# Altium footprint library 430 integreted.PcbLib: 281 footprints (part 14 of 18)
Each footprint in its own frame and in the unit in brackets; x right, y up, seen from the top. Pads: shape width x height; smd on the part's side, far side on the other; paste and mask are expansions set on the pad; w line width, h text height; cw(c..) or ccw(c..) is an arc to the next point about the centre after c.
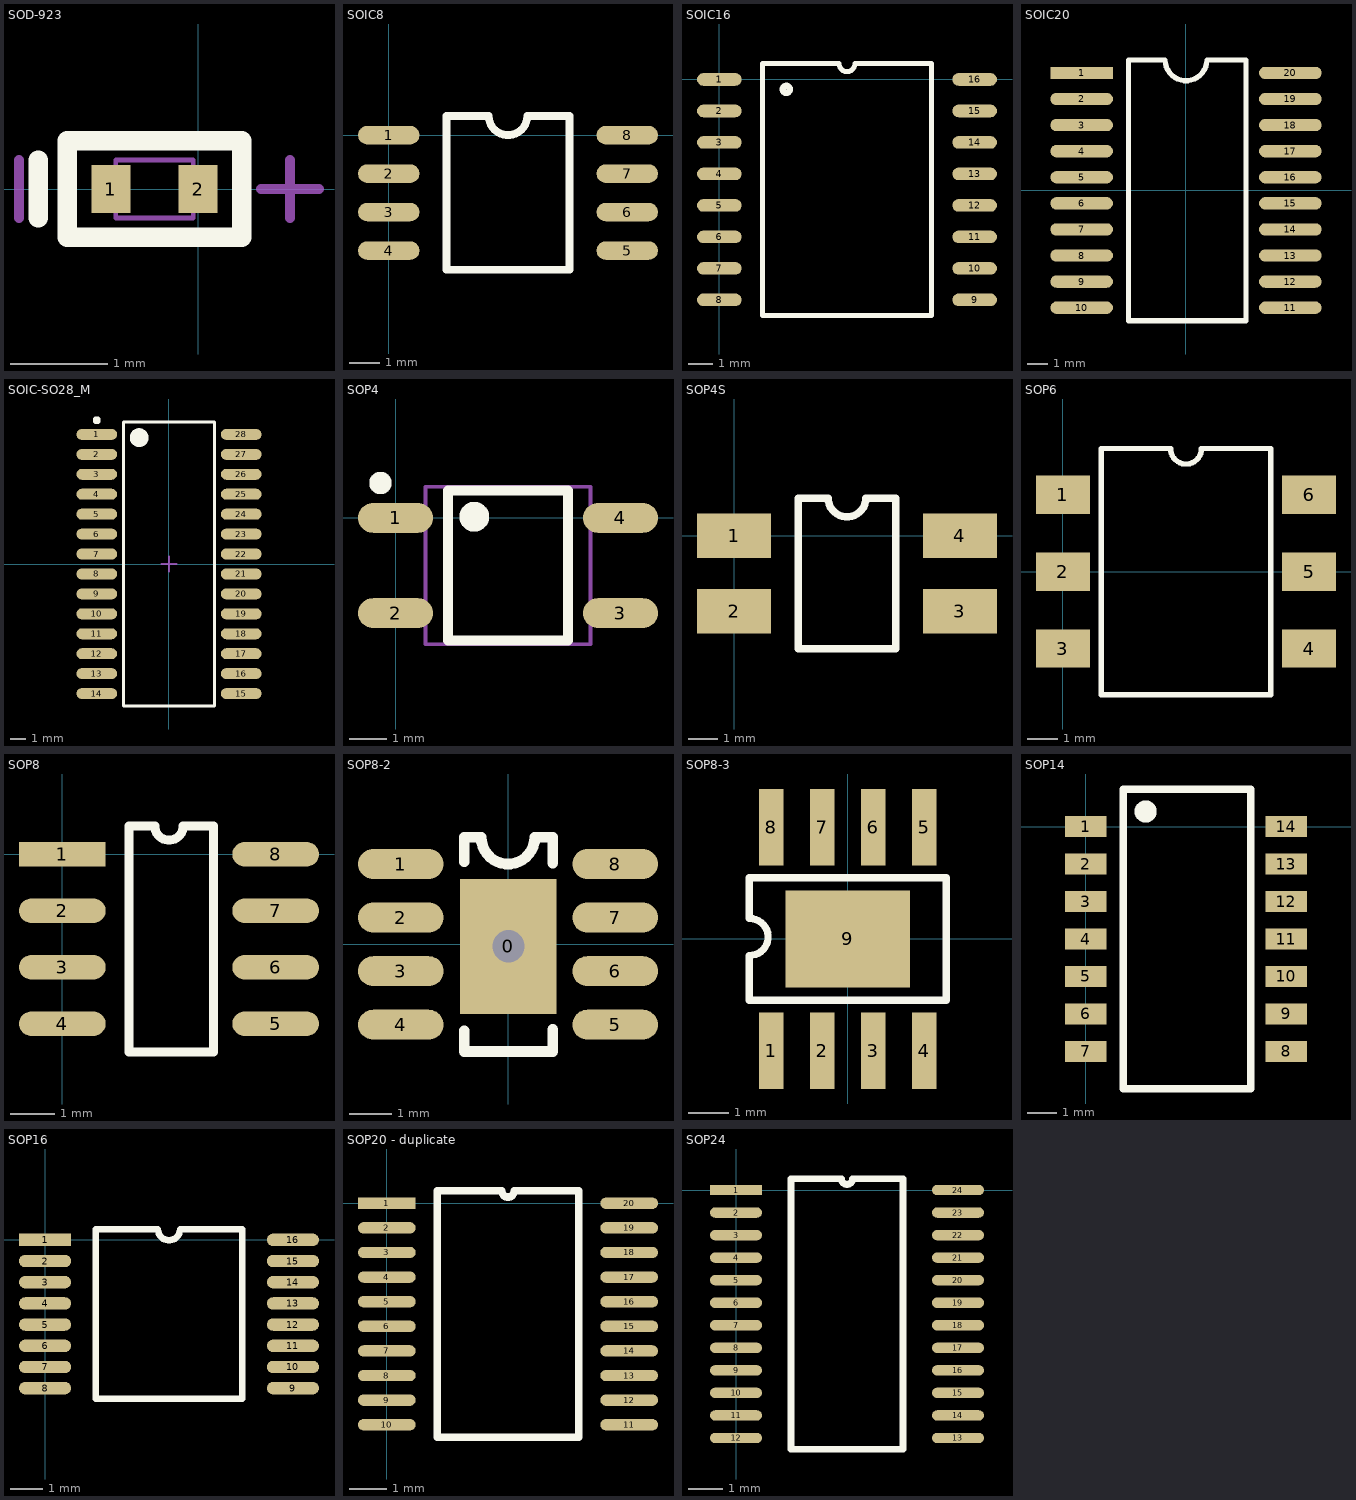
[diagram p13: the footprints below, top view; thin cyan lines are the x and y axes]

## SOD-923 [mm]
pads (2):
  rect 0.4x0.5 smd: 1(-0.9,0) 2(0,0)
Top Overlay:
  lines w0.2: -1.65,-0.3 -1.65,0.3 ; -1.35,-0.5 0.45,-0.5 0.45,0.5 -1.35,0.5 -1.35,-0.5
Mechanical 13:
  lines w0.05: -0.85,-0.3 -0.05,-0.3 -0.05,0.3 -0.85,0.3 -0.85,-0.3
Mechanical 15:
  lines w0.1: -1.85,-0.3 -1.85,0.3 ; 0.65,0 1.25,0 ; 0.95,-0.3 0.95,0.3
3D body: height 0.43, standoff 0, extent -0.975,-0.325 0.075,0.325

## SOIC8 [mil]
pads (8):
  oval 80x24 smd: 1(0,0) 2(0,-50) 3(0,-100) 4(0,-150) 5(310,-150) 6(310,-100) 7(310,-50) 8(310,0)
Top Overlay:
  lines w10: 75,-175 75,25 130,25 ccw(c155,25) 180,25 235,25 235,-175 75,-175
3D body: height 90.55, standoff -0.78, extent -12.2,-180.9 318.21,30.91

## SOIC16 [mm]
pads (16):
  oval 1.8x0.51 smd: 1(0,0) 2(0,-1.27) 3(0,-2.54) 4(0,-3.81) 5(0,-5.08) 6(0,-6.35) 7(0,-7.62) 8(0,-8.89) 9(10.3,-8.89) 10(10.3,-7.62) 11(10.3,-6.35) 12(10.3,-5.08) 13(10.3,-3.81) 14(10.3,-2.54) 15(10.3,-1.27) 16(10.3,0)
Top Overlay:
  lines w0.2: 1.735,-9.525 8.565,-9.525 8.565,0.635 5.467,0.635 cw(c5.15,0.635) 4.832,0.635 1.735,0.635 1.735,-9.525
  lines w0.254: 2.8,-0.3 ccw(c2.7,-0.4) 2.826,-0.337
3D body: height 2.75, standoff 0.1, extent -0.184,-9.695 10.446,0.805

## SOIC20 [mm]
pads (20):
  rect 3.048x0.6 smd: 1(-5.08,5.715)
  oval 3.048x0.6 smd: 2(-5.08,4.445) 3(-5.08,3.175) 4(-5.08,1.905) 5(-5.08,0.635) 6(-5.08,-0.635) 7(-5.08,-1.905) 8(-5.08,-3.175) 9(-5.08,-4.445) 10(-5.08,-5.715) 11(5.08,-5.715) 12(5.08,-4.445) 13(5.08,-3.175) 14(5.08,-1.905) 15(5.08,-0.635) 16(5.08,0.635) 17(5.08,1.905) 18(5.08,3.175) 19(5.08,4.445) 20(5.08,5.715)
Top Overlay:
  lines w0.254: -2.794,-6.35 -2.794,6.35 -1.016,6.35 ccw(c0,6.35) 1.016,6.35 2.921,6.35 2.921,-6.35 -2.794,-6.35
3D body: height 2.65, standoff 0, extent -5.125,-6.375 5.175,6.425

## SOIC-SO28_M [mm]
pads (28):
  oval 2.6x0.7 smd: 1(-4.6,8.255) 2(-4.6,6.985) 3(-4.6,5.715) 4(-4.6,4.445) 5(-4.6,3.175) 6(-4.6,1.905) 7(-4.6,0.635) 8(-4.6,-0.635) 9(-4.6,-1.905) 10(-4.6,-3.175) 11(-4.6,-4.445) 12(-4.6,-5.715) 13(-4.6,-6.985) 14(-4.6,-8.255) 15(4.6,-8.255) 16(4.6,-6.985) 17(4.6,-5.715) 18(4.6,-4.445) 19(4.6,-3.175) 20(4.6,-1.905) 21(4.6,-0.635) 22(4.6,0.635) 23(4.6,1.905) 24(4.6,3.175) 25(4.6,4.445) 26(4.6,5.715) 27(4.6,6.985) 28(4.6,8.255)
Top Overlay:
  circle w0.25: c-4.6,9.155 r0.125
  circle w0.6: c-1.9,8.05 r0.3
  lines w0.2: -2.9,-9.05 -2.9,9.05 2.9,9.05 2.9,-9.05 -2.9,-9.05
Mechanical 15:
  lines w0.1: -0.5,0 0.5,0 ; 0,-0.5 0,0.5
3D body: height 2.63, standoff -0.01, extent -5.36,-9.012 5.31,9.068

## SOP4 [mm]
pads (4):
  oval 2x0.8 smd: 1(0,0) 2(0,-2.54) 3(6,-2.54) 4(6,0)
Top Overlay:
  circle w0.3: c-0.4,0.93 r0.15
  circle w0.4: c2.1,0.03 r0.2
  lines w0.254: 1.4,-3.27 1.4,0.73 4.6,0.73 4.6,-3.27 1.4,-3.27
Mechanical 13:
  lines w0.1: 0.8,-3.37 0.8,0.83 5.2,0.83 5.2,-3.37 0.8,-3.37

## SOP4S [mm]
pads (4):
  rect 2.5x1.5 smd: 1(0,0) 2(0,-2.54) 3(7.62,-2.54) 4(7.62,0)
Top Overlay:
  lines w0.254: 2.159,-3.81 2.159,1.27 3.175,1.27 ccw(c3.81,1.27) 4.445,1.27 5.461,1.27 5.461,-3.81 2.159,-3.81
3D body: height 4.78, standoff -3, extent -0.156,-3.545 7.684,0.975

## SOP6 [mil]
pads (6):
  rect 70x50 smd: 1(0,100) 2(0,0) 3(0,-100) 4(320,-100) 5(320,0) 6(320,100)
Top Overlay:
  lines w7: 50,-160 270,-160 270,160 180,160 cw(c160,159.72) 140,160 50,160 50,-160

## SOP8 [mm]
pads (8):
  rect 1.95x0.55 smd: 1(0,0)
  oval 1.95x0.55 smd: 2(0,-1.27) 3(0,-2.54) 4(0,-3.81) 5(4.8,-3.81) 6(4.8,-2.54) 7(4.8,-1.27) 8(4.8,0)
Top Overlay:
  lines w0.2: 1.5,-4.445 1.5,0.635 2.083,0.635 ccw(c2.4,0.635) 2.718,0.635 3.4,0.635 3.4,-4.445 1.5,-4.445

## SOP8-2 [mil]
pads (9):
  rect 90x126 hole 30: 0(0.39,-1.77)
  oval 80x28 smd: 1(-100,75) 2(-100,25) 3(-100,-25) 4(-100,-75) 5(100,-75) 6(100,-25) 7(100,25) 8(100,75)
Top Overlay:
  lines w10: -40.94,-80.51 -40.94,-100 41.73,-100 41.73,-79.53 ; -40.94,76.97 -40.94,100 -28,100 ; -25,100 ccw(c0,100) 25,100 41.73,100 41.73,75.98
3D body: height 62.99, standoff 0, extent -117.93,-98.64 119.93,99

## SOP8-3 [mil]
pads (9):
  rect 24x75 smd: 1(-75,-109.5) 2(-25,-109.5) 3(25,-109.5) 4(75,-109.5) 5(75,109.5) 6(25,109.5) 7(-25,109.5) 8(-75,109.5)
  rect 122x95 smd: 9(0,0)
Top Overlay:
  lines w7: -96.5,20.03 -96.5,60 96.5,60 96.5,-60 -96.5,-60 -96.5,-16.02 ccw(c-96,2) -96,20.03
3D body: height 62.99, standoff 0, extent -98,-120.87 99.64,117

## SOP14 [mm] "SOP, 14-Leads, Body 10.3x5.0mm (max), Pitch 1.27mm, IPC Medium Density"
height 3.2
pads (14):
  rect 1.4x0.7 smd: 1(0,0) 2(0,-1.27) 3(0,-2.54) 4(0,-3.81) 5(0,-5.08) 6(0,-6.35) 7(0,-7.62) 8(6.8,-7.62) 9(6.8,-6.35) 10(6.8,-5.08) 11(6.8,-3.81) 12(6.8,-2.54) 13(6.8,-1.27) 14(6.8,0)
Top Overlay:
  circle w0.5: c2.032,0.508 r0.127
  lines w0.254: 1.27,-8.89 1.27,1.27 5.588,1.27 5.588,-8.89 1.27,-8.89

## SOP16 [mm]
pads (16):
  rect 1.6x0.38 smd: 1(0,0)
  oval 1.6x0.38 smd: 2(0,-0.65) 3(0,-1.3) 4(0,-1.95) 5(0,-2.6) 6(0,-3.25) 7(0,-3.9) 8(0,-4.55) 9(7.6,-4.55) 10(7.6,-3.9) 11(7.6,-3.25) 12(7.6,-2.6) 13(7.6,-1.95) 14(7.6,-1.3) 15(7.6,-0.65) 16(7.6,0)
Top Overlay:
  lines w0.2: 1.55,-4.875 6.05,-4.875 6.05,0.325 4.14,0.325 cw(c3.8,0.325) 3.46,0.325 1.55,0.325 1.55,-4.875

## SOP20 [mm]

## SOP20 - duplicate [mm]
pads (20):
  rect 1.524x0.3 smd: 1(0,0)
  oval 1.524x0.3 smd: 2(0,-0.65) 3(0,-1.3) 4(0,-1.95) 5(0,-2.6) 6(0,-3.25) 7(0,-3.9) 8(0,-4.55) 9(0,-5.2) 10(0,-5.85) 11(6.4,-5.85) 12(6.4,-5.2) 13(6.4,-4.55) 14(6.4,-3.9) 15(6.4,-3.25) 16(6.4,-2.6) 17(6.4,-1.95) 18(6.4,-1.3) 19(6.4,-0.65) 20(6.4,0)
Top Overlay:
  lines w0.2: 1.335,-6.175 1.335,0.325 3.037,0.325 ccw(c3.2,0.325) 3.362,0.325 5.065,0.325 5.065,-6.175 1.335,-6.175

## SOP24 [mm]
pads (24):
  rect 1.5x0.3 smd: 1(0,0)
  oval 1.5x0.3 smd: 2(0,-0.65) 3(0,-1.3) 4(0,-1.95) 5(0,-2.6) 6(0,-3.25) 7(0,-3.9) 8(0,-4.55) 9(0,-5.2) 10(0,-5.85) 11(0,-6.5) 12(0,-7.15) 13(6.4,-7.15) 14(6.4,-6.5) 15(6.4,-5.85) 16(6.4,-5.2) 17(6.4,-4.55) 18(6.4,-3.9) 19(6.4,-3.25) 20(6.4,-2.6) 21(6.4,-1.95) 22(6.4,-1.3) 23(6.4,-0.65) 24(6.4,0)
Top Overlay:
  lines w0.2: 1.585,-7.475 4.815,-7.475 4.815,0.325 3.362,0.325 cw(c3.2,0.325) 3.037,0.325 1.585,0.325 1.585,-7.475